# Altium footprint library TarabusLib_KAP.PcbLib: 504 footprints (part 10 of 32)
Each footprint in its own frame and in the unit in brackets; x right, y up, seen from the top. Pads: shape width x height; smd on the part's side, far side on the other; paste and mask are expansions set on the pad; w line width, h text height; cw(c..) or ccw(c..) is an arc to the next point about the centre after c.
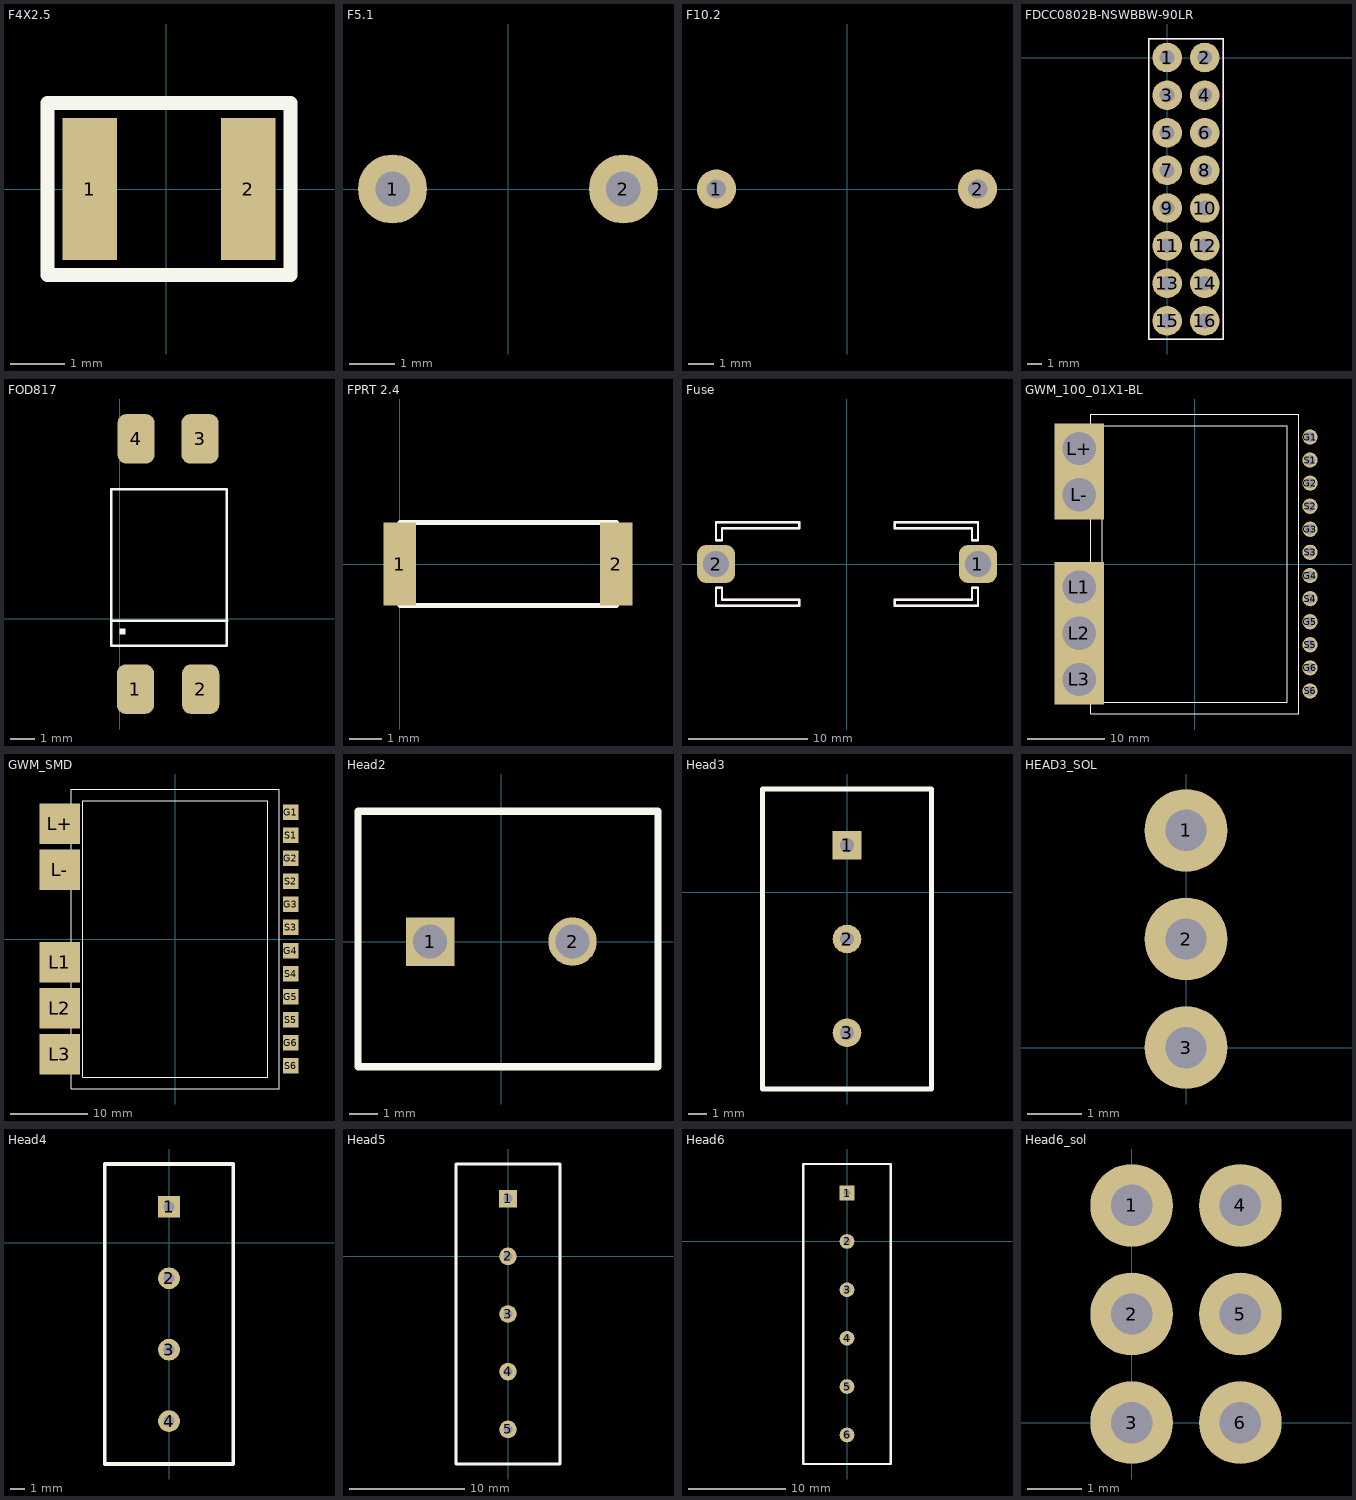
[diagram p9: the footprints below, top view; thin cyan lines are the x and y axes]

## F4X2.5 [mm]
pads (2):
  rect 1x2.6 smd: 1(-1.4,0) 2(1.5,0)
Top Overlay:
  lines w0.254: -2.175,1.55 -2.175,-1.575 2.275,-1.575 2.275,1.575 -2.175,1.575
3D body "MS-USMF005.STEP": height 0.81, standoff -0.01, extent -1.649,-1.25 1.751,1.27

## F5.1 [mil]
pads (2):
  round 60 hole 30: 1(-100.39,0) 2(100.39,0)
3D body "MF-R110.STEP": height 608.27, standoff -251.97, extent -185.31,-117.76 185.51,116.27

## F10.2 [mil]
pads (2):
  round 60 hole 30: 1(-200.79,0) 2(200.79,0)
3D body "MF-R500.STEP": height 90.29, standoff -31.23, extent -314.51,-618 370.52,385.94

## FDCC0802B-NSWBBW-90LR [mm]
pads (16):
  round 2 hole 1 mask+0: 1(0,0) 2(2.54,0) 3(0,-2.54) 4(2.54,-2.54) 5(0,-5.08) 6(2.54,-5.08) 7(0,-7.62) 8(2.54,-7.62) 9(0,-10.16) 10(2.54,-10.16) 11(0,-12.7) 12(2.54,-12.7) 13(0,-15.24) 14(2.54,-15.24) 15(0,-17.78) 16(2.54,-17.78)
Top Overlay:
  lines w0.1: -1.25,-19 -1.25,1.25 3.8,1.25 3.8,-19 -1.25,-19
Mechanical 7:
  lines w0.1: -1.25,-19 3.8,-19 3.8,1.25 -1.25,1.25 -1.25,-19

## FOD817 [mm]
pads (4):
  rrect50% 1.5x2 smd: 1(0.625,-2.825) 2(3.25,-2.825) 3(3.225,7.25) 4(0.65,7.25)
Top Overlay:
  rectangle: -0.025,-0.625 0.225,-0.375
  lines w0.1: -0.35,-0.075 4.325,-0.075 ; -0.35,-1.075 -0.35,5.225 4.3,5.225 4.3,-1.075 -0.35,-1.075
3D body "User Library-FOD817.step": height 4.8, standoff 0.2, extent -0.625,-3.025 4.475,7.435

## FPRT 2.4 [mm]
pads (2):
  rect 1x2.54 smd mask+0: 1(0,0) 2(6.6,0)
Top Overlay:
  lines w0.15: 0.01,-1.27 6.61,-1.27 6.61,1.27 0.01,1.27 0.01,-1.27
3D body: height 1.7, standoff 0, extent 0.01,-1.27 6.6,1.27

## Fuse [mm] "Fuse; 2 Leads"
pads (2):
  rrect50% 3.2x3.2 hole 2.2: 1(11,0) 2(-11,0)
Top Overlay:
  lines w0.2: -11,-3.5 -11,-2 -10.5,-2 -10.5,-3 -4,-3 -4,-3.5 -11,-3.5 ; -11,2 -11,3.5 -4,3.5 -4,3 -10.5,3 -10.5,2 -11,2 ; 4,-3.5 4,-3 10.5,-3 10.5,-2 11,-2 11,-3.5 4,-3.5 ; 4,3 4,3.5 11,3.5 11,2 10.5,2 10.5,3 4,3
Mechanical 7:
  lines w0.2: -11,-3.5 -4,-3.5 -4,-3 -10.5,-3 -10.5,-2 -11,-2 -11,-3.5 ; -11,2 -10.5,2 -10.5,3 -4,3 -4,3.5 -11,3.5 -11,2 ; 4,-3.5 11,-3.5 11,-2 10.5,-2 10.5,-3 4,-3 4,-3.5 ; 4,3 10.5,3 10.5,2 11,2 11,3.5 4,3.5 4,3
Mechanical 10:
  text ".Comment" at 7,4.5 h0.6
  text ".Designator" at 6.65,5.4 h0.8

## GWM_100_01X1-BL [mil]
pads (17):
  round 78 hole 52: G1(591,650) G2(591,414) G3(591,178) G4(591,-59.06) G5(591,-295.28) G6(591,-531.5) S1(591,532) S2(591,296) S3(591,60) S4(591,-177.17) S5(591,-413.39) S6(591,-649.61)
  rect 255x255 hole 170: L1(-590.55,-118.11) L2(-590.55,-354.33) L3(-590.55,-590.55) L+(-590.55,591) L-(-590.55,355)
Top Overlay:
  lines w5: -531.5,-767.72 -531.5,768 532,768 532,-767.72 -531.5,-767.72 ; -472.44,-708.66 473,-708.66 473,709 -472.44,709 -472.44,-708.66

## GWM_SMD [mil]
pads (17):
  rect 79x79 smd: G1(591,650) G2(591,414) G3(591,178) G4(591,-59.06) G5(591,-295.28) G6(591,-531.5) S1(591,532) S2(591,296) S3(591,60) S4(591,-177.17) S5(591,-413.39) S6(591,-649.61)
  rect 207x207 smd: L1(-590.55,-118.11) L2(-590.55,-354.33) L3(-590.55,-590.55) L+(-590.55,591) L-(-590.55,355)
Top Overlay:
  lines w5: -531.5,-767.72 -531.5,768 532,768 532,-767.72 -531.5,-767.72 ; -472.44,-708.66 473,-708.66 473,709 -472.44,709 -472.44,-708.66

## Head2 [mm]
pads (2):
  rect 1.7x1.7 hole 1.2: 1(-2.5,0)
  round 1.7 hole 1.2: 2(2.5,0)
Top Overlay:
  lines w0.254: -5.029,-4.394 -5.029,4.572 5.5,4.572 5.5,-4.394 -5.029,-4.394
3D body "Клеммник DT128V.STEP": height 15.2, standoff -3.5, extent -4.996,-4.377 5.504,4.623

## Head3 [mil]
pads (3):
  rect 60x60 hole 30: 1(0,98.43)
  round 60 hole 30: 2(0,-98.43) 3(0,-295.28)
Top Overlay:
  lines w10: -177.17,-413.39 -177.17,-216.54 -177.17,216.54 177.17,216.54 177.17,-216.54 177.17,-413.39 -177.17,-413.39
3D body: height 610.24, standoff 0, extent -177.17,-413.39 177.17,216.54

## HEAD3_SOL [mil]
pads (3):
  round 60 hole 30: 1(0,157.48) 2(0,78.74) 3(0,0)

## Head4 [mil]
pads (4):
  rect 60x60 hole 30: 1(0,98.43)
  round 60 hole 30: 2(0,-98.43) 3(0,-295.28) 4(0,-492.13)
Top Overlay:
  lines w10: -177.17,-610.24 -177.17,216.54 177.17,216.54 177.17,-610.24 -177.17,-610.24
3D body: height 610.24, standoff 0, extent -177.17,-610.24 177.17,216.54

## Head5 [mil]
pads (5):
  rect 60x60 hole 30: 1(0,196.85)
  round 60 hole 30: 2(0,0) 3(0,-196.85) 4(0,-393.7) 5(0,-590.55)
Top Overlay:
  lines w10: -177.17,-708.66 177.17,-708.66 177.17,314.96 -177.17,314.96 -177.17,-118.11 -177.17,-708.66
3D body: height 610.24, standoff 0, extent -177.17,-708.66 177.17,314.96

## Head6 [mil]
pads (6):
  rect 60x60 hole 30: 1(0,196.85)
  round 60 hole 30: 2(0,0) 3(0,-196.85) 4(0,-393.7) 5(0,-590.55) 6(0,-787.4)
Top Overlay:
  lines w10: -177.17,-905.51 -177.17,-118.11 -177.17,314.96 177.17,314.96 177.17,-118.11 177.17,-905.51 -177.17,-905.51
3D body: height 610.24, standoff 0, extent -177.17,-905.51 177.17,314.96

## Head6_sol [mil]
pads (6):
  round 60 hole 30: 1(0,157.48) 2(0,78.74) 3(0,0) 4(78.74,157.48) 5(78.74,78.74) 6(78.74,0)